# Altium footprint library UWRT Footprint Library.PcbLib: 258 footprints (part 17 of 17)
Each footprint in its own frame and in the unit in brackets; x right, y up, seen from the top. Pads: shape width x height; smd on the part's side, far side on the other; paste and mask are expansions set on the pad; w line width, h text height; cw(c..) or ccw(c..) is an arc to the next point about the centre after c.
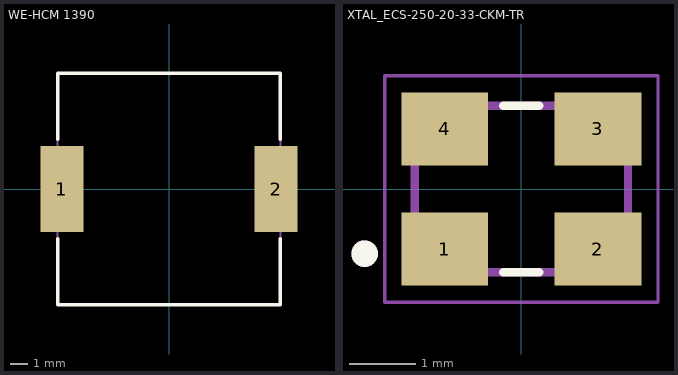
[diagram p16: the footprints below, top view; thin cyan lines are the x and y axes]

## WE-HCM 1390 [mm] "SMD Inductor, 2-Leads, Body 12,50x13,00mm"
height 9.5
pads (2):
  rect 2.5x5 smd: 1(-6.25,0) 2(6.25,0)
Top Overlay:
  lines w0.2: -6.5,-2.9 -6.5,-6.75 6.5,-6.75 6.5,-2.9 ; -6.5,2.9 -6.5,6.75 6.5,6.75 6.5,2.9
Mechanical 13:
  lines w0.1: -6.5,-6.75 -6.5,6.75 6.5,6.75 6.5,-6.75 -6.5,-6.75
3D body "7443090xx.stp": height 8.95, standoff -0.05, extent -7,-6.5 7,6.5

## XTAL_ECS-250-20-33-CKM-TR [mm]
pads (4):
  rect 1.3x1.1 smd: 1(-1.15,-0.9) 2(1.15,-0.9) 3(1.15,0.9) 4(-1.15,0.9)
Top Overlay:
  circle w0.2: c-2.35,-0.97 r0.1
  lines w0.127: -0.27,-1.25 0.27,-1.25 ; -0.27,1.25 0.27,1.25
Mechanical 13:
  circle w0.2: c-2.35,-0.97 r0.1
  lines w0.127: -1.6,-1.25 -1.6,1.25 1.6,1.25 1.6,-1.25 -1.6,-1.25
Mechanical 15:
  lines w0.05: -2.05,-1.7 -2.05,1.7 2.05,1.7 2.05,-1.7 -2.05,-1.7
3D body "ECS-250-20-33-CKM-TR.STEP": height 0.8, standoff 0, extent -1.617,-1.25 1.583,1.25